# Altium footprint library Components.PcbLib: 134 footprints (part 9 of 9)
Each footprint in its own frame and in the unit in brackets; x right, y up, seen from the top. Pads: shape width x height; smd on the part's side, far side on the other; paste and mask are expansions set on the pad; w line width, h text height; cw(c..) or ccw(c..) is an arc to the next point about the centre after c.
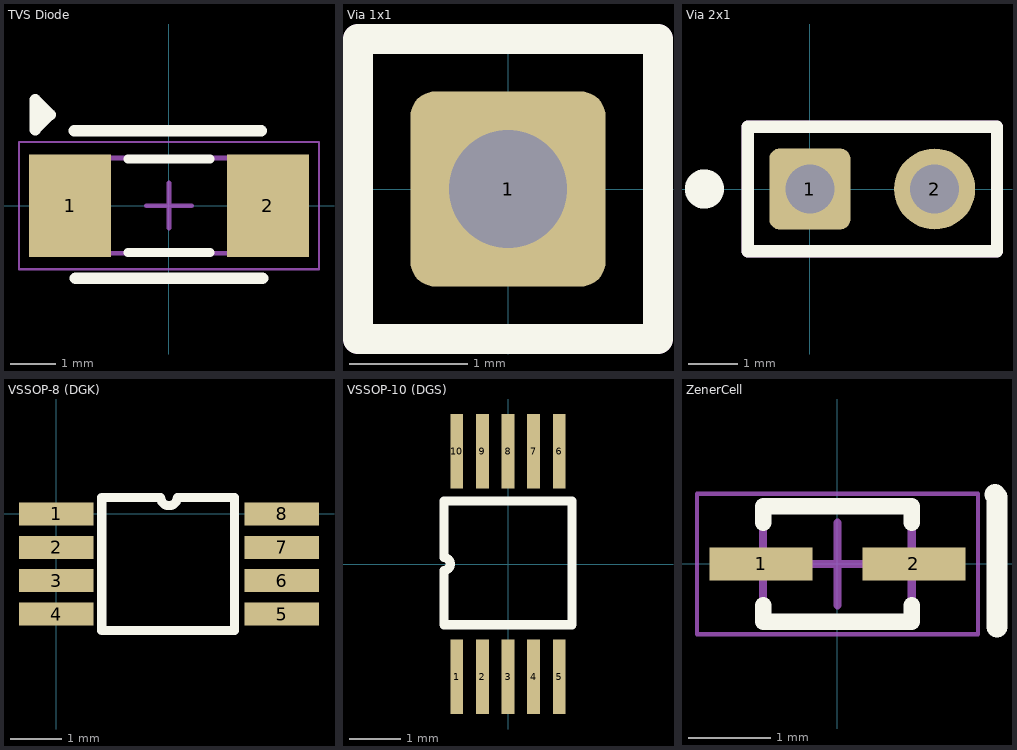
[diagram p8: the footprints below, top view; thin cyan lines are the x and y axes]

## TVS Diode [mm] "Chip Diode, 2-Leads, Body 5.24x2.10mm, IPC Medium Density"
height 2.62
pads (2):
  rect 1.8x2.25 smd: 1(-2.175,0) 2(2.175,0)
Top Overlay:
  lines w0.2: -0.9,-1.025 0.9,-1.025 ; -0.9,1.025 0.9,1.025
  lines w0.254: -2.845,2.057 -2.794,2.007 -2.616,2.007 ; -2.083,1.651 2.032,1.651 ; -2.057,-1.6 2.057,-1.6 ; -2.616,2.007 -2.946,2.337 -2.946,1.676 -2.616,2.007
Mechanical 13:
  lines w0.1: -2.62,-1.05 -2.62,1.05 2.62,1.05 2.62,-1.05 -2.62,-1.05
Mechanical 15:
  lines w0.05: -3.3,-1.4 -3.3,1.4 3.3,1.4 3.3,-1.4 -3.3,-1.4
  lines w0.1: -0.5,0 0.5,0 ; 0,-0.5 0,0.5
3D body "SMASeries.step": height 2.34, standoff 0, extent -2.667,-1.498 2.617,1.296

## Via 1x1 [mil]
pads (1):
  rrect25% 65x65 hole 39.37: 1(0,0)
Top Overlay:
  lines w10: -50,50 50,50 ; -50,50 -50,-50 50,-50 50,50 ; -50,50 50,50
Mechanical 3:
  lines w10: -50,50 50,50 ; -50,50 -50,-50 50,-50 50,50 ; -50,50 50,50

## Via 2x1 [mil]
pads (2):
  rrect25% 65x65 hole 39.37: 1(0,0)
  round 65 hole 39.37: 2(100,0)
Top Overlay:
  circle w19.68: c-84.65,0 r5.91
  lines w10: 50,50 -50,50 ; -50,50 -50,-50 150,-50 150,50 -50,50
Mechanical 3:
  lines w10: 50,50 -50,50 ; -50,50 -50,-50 150,-50 150,50 -50,50

## VSSOP-8 (DGK) [mm]
pads (8):
  rect 1.45x0.45 smd mask+0.025: 1(0,0) 2(0,-0.65) 3(0,-1.3) 4(0,-1.95) 5(4.4,-1.95) 6(4.4,-1.3) 7(4.4,-0.65) 8(4.4,0)
Top Overlay:
  lines w0.178: 3.429,-2.275 0.889,-2.275 0.889,0.325 2.037,0.325 ccw(c2.2,0.325) 2.362,0.325 3.429,0.325 ; 3.48,-2.275 3.48,0.325

## VSSOP-10 (DGS) [mm]
height 1.1
pads (10):
  rect 0.25x1.45 smd mask+0.05: 1(-1,-2.2) 2(-0.5,-2.2) 3(0,-2.2) 4(0.5,-2.2) 5(1,-2.2) 6(1,2.2) 7(0.5,2.2) 8(0,2.2) 9(-0.5,2.2) 10(-1,2.2)
Top Overlay:
  lines w0.178: -1.25,-1.184 -1.25,-0.125 ccw(c-1.25,0) -1.25,0.125 -1.25,1.229 1.25,1.229 1.25,-1.184 -1.25,-1.184

## ZenerCell [mm] "SODFL, 2-Leads, Body 1.25x2.50mm, IPC Medium Density"
height 0.9
pads (2):
  rect 1.25x0.4 smd: 1(-0.925,0) 2(0.925,0)
Top Overlay:
  lines w0.2: -0.9,-0.5 -0.9,-0.7 0.9,-0.7 0.9,-0.5 ; -0.9,0.5 -0.9,0.7 0.9,0.7 0.9,0.5
  lines w0.254: 1.905,0.838 1.93,0.813 1.93,-0.762
Mechanical 13:
  lines w0.1: -0.9,-0.675 -0.9,0.675 0.9,0.675 0.9,-0.675 -0.9,-0.675
Mechanical 15:
  lines w0.05: -1.7,-0.85 -1.7,0.85 1.7,0.85 1.7,-0.85 -1.7,-0.85
  lines w0.1: -0.5,0 0.5,0 ; 0,-0.5 0,0.5
3D body "UMD2.stp": height 0.69, standoff -0.01, extent -1.25,-0.625 1.25,0.625